# Altium footprint library microbuilder.PCBLIB: 422 footprints (part 21 of 27)
Each footprint in its own frame and in the unit in brackets; x right, y up, seen from the top. Pads: shape width x height; smd on the part's side, far side on the other; paste and mask are expansions set on the pad; w line width, h text height; cw(c..) or ccw(c..) is an arc to the next point about the centre after c.
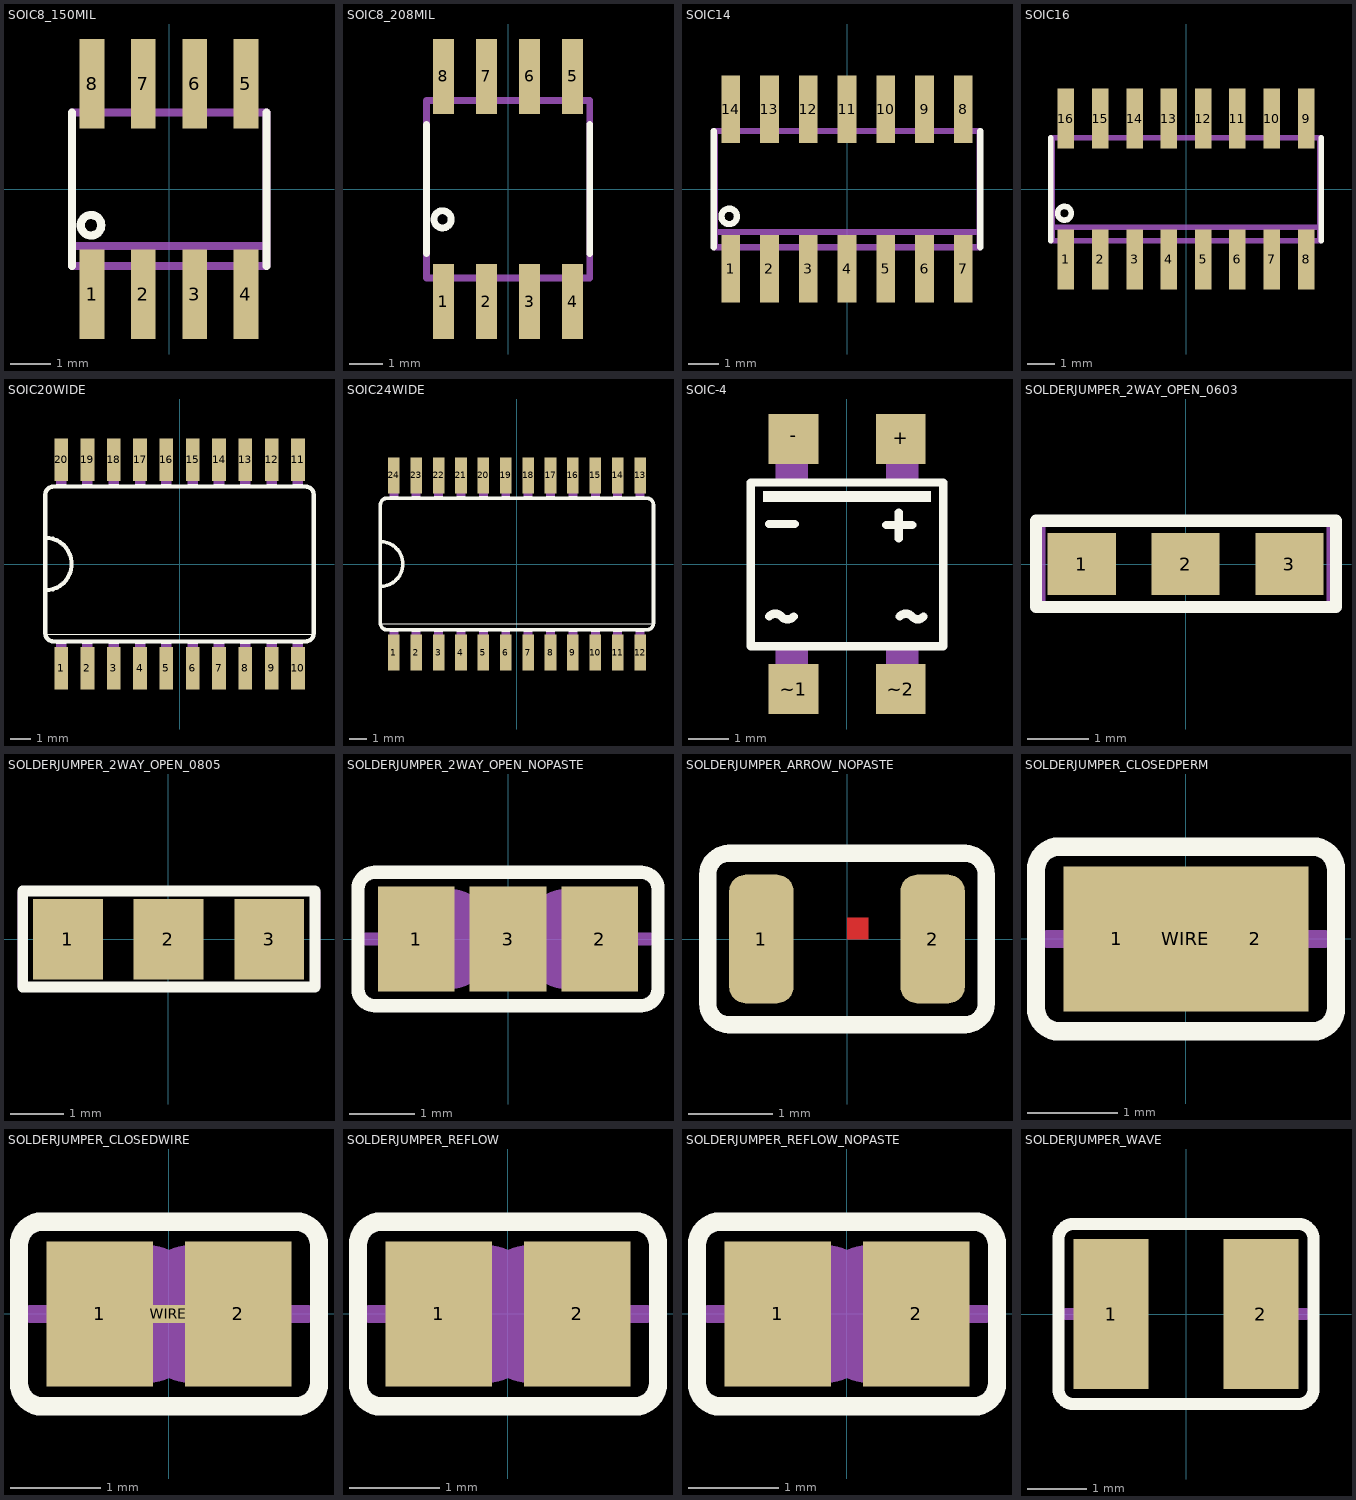
[diagram p20: the footprints below, top view; thin cyan lines are the x and y axes]

## SOIC8_150MIL [mil]
pads (8):
  rect 24x87 smd: 1(-75,-102.36) 2(-25,-102.36) 3(25,-102.36) 4(75,-102.36) 5(75,103) 6(25,103) 7(-25,103) 8(-75,103)
Top Overlay:
  circle w8: c-76,-35 r10
  lines w8: -94.49,-74.8 -94.49,75 ; 95,-74.8 95,75
Mechanical 16:
  rectangle: -84.65,-122.05 -65.35,-78.74
  rectangle: -34.65,-122.05 -15.35,-78.74
  rectangle: 16,-122.05 35,-78.74
  rectangle: 66,-122.05 85,-78.74
  rectangle: 66,79 85,123
  rectangle: 16,79 35,123
  rectangle: -34.65,79 -15.35,123
  rectangle: -84.65,79 -65.35,123
  lines w8: -94.49,-55.12 -94.49,-74.8 95,-74.8 95,-55.12 ; -94.49,-55.12 -94.49,75 95,75 95,-55.12 ; -94.49,-55.12 95,-55.12

## SOIC8_208MIL [mil]
pads (8):
  rect 24x87 smd: 1(-75,-130.51) 2(-25,-130.51) 3(25,-130.51) 4(75,-130.51) 5(75,131) 6(25,131) 7(-25,131) 8(-75,131)
Top Overlay:
  circle w8: c-76,-35 r10
  lines w8: -94.49,-74.8 -94.49,75 ; 95,-74.8 95,75
Mechanical 16:
  rectangle: -84.65,-150.2 -65.35,-106.89
  rectangle: -34.65,-150.2 -15.35,-106.89
  rectangle: 16,-150.2 35,-106.89
  rectangle: 66,-150.2 85,-106.89
  rectangle: 66,107 85,151
  rectangle: 16,107 35,151
  rectangle: -34.65,107 -15.35,151
  rectangle: -84.65,107 -65.35,151
  lines w8: -94.49,-102.95 95,-102.95 95,103 -94.49,103 -94.49,-102.95

## SOIC14 [mil]
pads (14):
  rect 24x87 smd: 1(-150,-102.36) 2(-100,-102.36) 3(-50,-102.36) 4(0,-102.36) 5(50,-102.36) 6(100,-102.36) 7(150,-102.36) 8(150,103) 9(100,103) 10(50,103) 11(0,103) 12(-50,103) 13(-100,103) 14(-150,103)
Top Overlay:
  circle w8: c-152,-35 r10
  lines w8: -171.85,-74.8 -171.85,75 ; 172,-74.8 172,75
Mechanical 16:
  rectangle: -159.65,-122.05 -140.35,-78.74
  rectangle: -109.65,-122.05 -90.35,-78.74
  rectangle: -59.65,-122.05 -40.35,-78.74
  rectangle: -9.65,-122.05 10,-78.74
  rectangle: 91,79 110,123
  rectangle: 41,79 60,123
  rectangle: -9.65,79 10,123
  rectangle: -59.65,79 -40.35,123
  rectangle: 41,-122.05 60,-78.74
  rectangle: 91,-122.05 110,-78.74
  rectangle: 141,-122.05 160,-78.74
  rectangle: 141,79 160,123
  rectangle: -109.65,79 -90.35,123
  rectangle: -159.65,79 -140.35,123
  lines w8: -170.28,-55.12 -170.28,-74.8 171,-74.8 171,-55.12 ; -170.28,-55.12 -170.28,75 171,75 171,-55.12 ; -170.28,-55.12 171,-55.12

## SOIC16 [mil]
pads (16):
  rect 24x87 smd: 1(-175,-102.36) 2(-125,-102.36) 3(-75,-102.36) 4(-25,-102.36) 5(25,-102.36) 6(75,-102.36) 7(125,-102.36) 8(175,-102.36) 9(175,103) 10(125,103) 11(75,103) 12(25,103) 13(-25,103) 14(-75,103) 15(-125,103) 16(-175,103)
Top Overlay:
  circle w8: c-177,-35 r10
  lines w8: -196.85,-74.8 -196.85,75 ; 197,-74.8 197,75
Mechanical 16:
  rectangle: -184.65,-122.05 -165.35,-78.74
  rectangle: -134.65,-122.05 -115.35,-78.74
  rectangle: -84.65,-122.05 -65.35,-78.74
  rectangle: -34.65,-122.05 -15.35,-78.74
  rectangle: 66,79 85,123
  rectangle: 16,79 35,123
  rectangle: -34.65,79 -15.35,123
  rectangle: -84.65,79 -65.35,123
  rectangle: 16,-122.05 35,-78.74
  rectangle: 66,-122.05 85,-78.74
  rectangle: 116,-122.05 135,-78.74
  rectangle: 166,-122.05 185,-78.74
  rectangle: 166,79 185,123
  rectangle: 116,79 135,123
  rectangle: -134.65,79 -115.35,123
  rectangle: -184.65,79 -165.35,123
  lines w8: -194.49,-55.12 -194.49,-74.8 195,-74.8 195,-55.12 ; -194.49,-55.12 -194.49,75 195,75 195,-55.12 ; -194.49,-55.12 195,-55.12

## SOIC20WIDE [mil]
pads (20):
  rect 26x80 smd: 1(-225,-198) 2(-175,-198) 3(-125,-198) 4(-75,-198) 5(-25,-198) 6(25,-198) 7(75,-198) 8(125,-198) 9(175,-198) 10(225,-198) 11(225,198) 12(175,198) 13(125,198) 14(75,198) 15(25,198) 16(-25,198) 17(-75,198) 18(-125,198) 19(-175,198) 20(-225,198)
Top Overlay:
  rectangle: -235,-152 -215,-147
  rectangle: -185,-152 -165,-147
  rectangle: -135,-152 -115,-147
  rectangle: -85,-152 -65,-147
  rectangle: -35,-152 -15,-147
  rectangle: 15,-152 35,-147
  rectangle: 65,-152 85,-147
  rectangle: 115,-152 135,-147
  rectangle: -235,147 -215,152
  rectangle: -185,147 -165,152
  rectangle: -135,147 -115,152
  rectangle: -85,147 -65,152
  rectangle: -35,147 -15,152
  rectangle: 15,147 35,152
  rectangle: 65,147 85,152
  rectangle: 115,147 135,152
  rectangle: 165,147 185,152
  rectangle: 215,147 235,152
  rectangle: 165,-152 185,-147
  rectangle: 215,-152 235,-147
  lines w2: -255,-133 255,-133
  lines w8: -255,-50 -255,50 ; -255,-50 -255,-132 ccw(c-240,-132) -240,-147 240,-147 ccw(c240,-132) 255,-132 255,132 ccw(c240,132) 240,147 -240,147 ccw(c-240,132) -255,132 -255,50 ; -255,-50 ccw(c-255,0) -255,50
Mechanical 16:
  rectangle: -235,-210 -215,-152
  rectangle: -185,-210 -165,-152
  rectangle: -135,-210 -115,-152
  rectangle: -85,-210 -65,-152
  rectangle: -35,-210 -15,-152
  rectangle: 15,-210 35,-152
  rectangle: 65,-210 85,-152
  rectangle: 115,-210 135,-152
  rectangle: -235,152 -215,210
  rectangle: -185,152 -165,210
  rectangle: -135,152 -115,210
  rectangle: -85,152 -65,210
  rectangle: -35,152 -15,210
  rectangle: 15,152 35,210
  rectangle: 65,152 85,210
  rectangle: 115,152 135,210
  rectangle: 165,152 185,210
  rectangle: 215,152 235,210
  rectangle: 165,-210 185,-152
  rectangle: 215,-210 235,-152

## SOIC24WIDE [mil]
pads (24):
  rect 26x80 smd: 1(-275,-198) 2(-225,-198) 3(-175,-198) 4(-125,-198) 5(-75,-198) 6(-25,-198) 7(25,-198) 8(75,-198) 9(125,-198) 10(175,-198) 11(225,-198) 12(275,-198) 13(275,198) 14(225,198) 15(175,198) 16(125,198) 17(75,198) 18(25,198) 19(-25,198) 20(-75,198) 21(-125,198) 22(-175,198) 23(-225,198) 24(-275,198)
Top Overlay:
  rectangle: -285,-152 -265,-147
  rectangle: -235,-152 -215,-147
  rectangle: -185,-152 -165,-147
  rectangle: -135,-152 -115,-147
  rectangle: -85,-152 -65,-147
  rectangle: -35,-152 -15,-147
  rectangle: 15,-152 35,-147
  rectangle: 65,-152 85,-147
  rectangle: -285,147 -265,152
  rectangle: -235,147 -215,152
  rectangle: -185,147 -165,152
  rectangle: -135,147 -115,152
  rectangle: -85,147 -65,152
  rectangle: -35,147 -15,152
  rectangle: 15,147 35,152
  rectangle: 65,147 85,152
  rectangle: 115,147 135,152
  rectangle: 165,147 185,152
  rectangle: 215,147 235,152
  rectangle: 265,147 285,152
  rectangle: 115,-152 135,-147
  rectangle: 165,-152 185,-147
  rectangle: 215,-152 235,-147
  rectangle: 265,-152 285,-147
  lines w2: -305,-133 305,-133
  lines w8: -305,-50 -305,50 ; -305,-50 -305,-132 ccw(c-290,-132) -290,-147 290,-147 ccw(c290,-132) 305,-132 305,132 ccw(c290,132) 290,147 -290,147 ccw(c-290,132) -305,132 -305,50 ; -305,-50 ccw(c-305,0) -305,50
Mechanical 16:
  rectangle: -285,-210 -265,-152
  rectangle: -235,-210 -215,-152
  rectangle: -185,-210 -165,-152
  rectangle: -135,-210 -115,-152
  rectangle: -85,-210 -65,-152
  rectangle: -35,-210 -15,-152
  rectangle: 15,-210 35,-152
  rectangle: 65,-210 85,-152
  rectangle: -285,152 -265,210
  rectangle: -235,152 -215,210
  rectangle: -185,152 -165,210
  rectangle: -135,152 -115,210
  rectangle: -85,152 -65,210
  rectangle: -35,152 -15,210
  rectangle: 15,152 35,210
  rectangle: 65,152 85,210
  rectangle: 115,152 135,210
  rectangle: 165,152 185,210
  rectangle: 215,152 235,210
  rectangle: 265,152 285,210
  rectangle: 115,-210 135,-152
  rectangle: 165,-210 185,-152
  rectangle: 215,-210 235,-152
  rectangle: 265,-210 285,-152

## SOIC-4 [mil]
pads (4):
  rect 48x48 smd: +(52,121) -(-51.18,121) ~1(-51.18,-120.08) ~2(52,-120.08)
Top Overlay:
  rectangle: -80.71,60 81,71
  lines w8: -75,39 -50,39 ; -74.8,-50.2 cw(c-68.9,-55.16) -62.99,-50.2 ccw(c-57.09,-45.24) -51.18,-50.2 ; 38,38 63,38 ; 50,25 50,50 ; 51,-50.2 cw(c57,-55.24) 63,-50.2 ccw(c68.5,-45.58) 74,-50.2 ; -92.52,-78.74 93,-78.74 93,79 -92.52,79 -92.52,-78.74
Mechanical 16:
  rectangle: -68.9,81 -37.4,136
  rectangle: 38,81 69,136
  region: 69,-80.71 38,-80.71 38,-135.83 69,-135.83
  region: -37.4,-80.71 -68.9,-80.71 -68.9,-135.83 -37.4,-135.83

## SOLDERJUMPER_2WAY_OPEN_0603 [mil]
pads (3):
  rect 44x40 smd: 1(-66.93,0) 2(0,0) 3(67,0)
Top Overlay:
  lines w8: -96.46,-27.56 97,-27.56 97,28 -96.46,28 -96.46,-27.56
Mechanical 16:
  text "1" at -73.58,-11.54 h37.2
  text "2" at -8.94,-11.54 h37.2
  text "3" at 61,-11.54 h37.2
Mechanical 27:
  lines w2: -91.46,-28.7 92,-28.7 92,29 -91.46,29 -91.46,-28.7

## SOLDERJUMPER_2WAY_OPEN_0805 [mil]
pads (3):
  rect 52x60 smd: 1(-74.8,0) 2(0,0) 3(75,0)
Top Overlay:
  lines w8: -108.27,-35.43 109,-35.43 109,36 -108.27,36 -108.27,-35.43
Mechanical 16:
  text "1" at -80.71,-7.87 h37.2
  text "2" at -5.91,-7.87 h37.2
  text "3" at 69,-7.87 h37.2
Mechanical 27:
  lines w2: -111.14,-34.76 112,-34.76 112,35 -111.14,35 -111.14,-34.76

## SOLDERJUMPER_2WAY_OPEN_NOPASTE [mil]
pads (3):
  rect 46x63 smd: 1(-55,0) 2(55,0) 3(0,0)
Top Overlay:
  lines w8: -90,-30 ccw(c-80,-30) -80,-40 80,-40 ccw(c80,-30) 90,-30 90,30 ccw(c80,30) 80,40 -80,40 ccw(c-80,30) -90,30 -90,-30
Mechanical 16:
  rectangle: -20,-30 20,30
  lines w8: -85,0 -65,0 ; 65,0 85,0
  lines w50: -35,-5 cw(c-35,0) -35,5 ; 35,-5 ccw(c35,0) 35,5
  text "1" at -130,-25 h77.5
  text "3" at 100,-25 h77.5

## SOLDERJUMPER_ARROW_NOPASTE [mil]
pads (2):
  rrect50% 30x60 smd: 1(-40,0) 2(40,0)
Top Layer:
  region: 0,0 10,0 10,10 0,10
  region: 0,0 10,0 10,10 0,10
Top Overlay:
  lines w8: -65,-30 ccw(c-55,-30) -55,-40 55,-40 ccw(c55,-30) 65,-30 65,30 ccw(c55,30) 55,40 -55,40 ccw(c-55,30) -65,30 -65,-30
Top Solder:
  rectangle: -57.5,-32.5 58,33

## SOLDERJUMPER_CLOSEDPERM [mil]
pads (3):
  rect 46x63 smd: 1(-30,0) 2(30,0)
  rect 25x63 smd: WIRE(0,0)
Top Overlay:
  lines w8: -65,-30 ccw(c-55,-30) -55,-40 55,-40 ccw(c55,-30) 65,-30 65,30 ccw(c55,30) 55,40 -55,40 ccw(c-55,30) -65,30 -65,-30
Top Solder:
  rectangle: -3,-36 3,36
Mechanical 16:
  lines w8: -60,0 -40,0 ; 40,0 60,0
  lines w50: -10,-5 cw(c-10,0) -10,5 ; 10,-5 ccw(c10,0) 10,5

## SOLDERJUMPER_CLOSEDWIRE [mil]
pads (3):
  rect 46x63 smd: 1(-30,0) 2(30,0)
  rect 25x8 smd: WIRE(0,0)
Top Overlay:
  lines w8: -65,-30 ccw(c-55,-30) -55,-40 55,-40 ccw(c55,-30) 65,-30 65,30 ccw(c55,30) 55,40 -55,40 ccw(c-55,30) -65,30 -65,-30
Top Solder:
  rectangle: -3,-36 3,36
Mechanical 16:
  lines w8: -60,0 -40,0 ; 40,0 60,0
  lines w50: -10,-5 cw(c-10,0) -10,5 ; 10,-5 ccw(c10,0) 10,5

## SOLDERJUMPER_REFLOW [mil]
pads (2):
  rect 46x63 smd: 1(-30,0) 2(30,0)
Top Overlay:
  lines w8: -65,-30 ccw(c-55,-30) -55,-40 55,-40 ccw(c55,-30) 65,-30 65,30 ccw(c55,30) 55,40 -55,40 ccw(c-55,30) -65,30 -65,-30
Top Solder:
  rectangle: -3,-36 3,36
Mechanical 16:
  lines w8: -60,0 -40,0 ; 40,0 60,0
  lines w50: -10,-5 cw(c-10,0) -10,5 ; 10,-5 ccw(c10,0) 10,5

## SOLDERJUMPER_REFLOW_NOPASTE [mil]
pads (2):
  rect 46x63 smd: 1(-30,0) 2(30,0)
Top Overlay:
  lines w8: -65,-30 ccw(c-55,-30) -55,-40 55,-40 ccw(c55,-30) 65,-30 65,30 ccw(c55,30) 55,40 -55,40 ccw(c-55,30) -65,30 -65,-30
Top Solder:
  rectangle: -3,-36 3,36
Mechanical 16:
  lines w8: -60,0 -40,0 ; 40,0 60,0
  lines w50: -10,-5 cw(c-10,0) -10,5 ; 10,-5 ccw(c10,0) 10,5

## SOLDERJUMPER_WAVE [mil]
pads (2):
  rect 50x100 smd: 1(-50,0) 2(50,0)
Top Overlay:
  lines w8: -85,-50 ccw(c-75,-50) -75,-60 75,-60 ccw(c75,-50) 85,-50 85,50 ccw(c75,50) 75,60 -75,60 ccw(c-75,50) -85,50 -85,-50
Mechanical 16:
  rectangle: 30,-30 40,30
  rectangle: 40,-25 50,25
  rectangle: 50,-20 55,20
  rectangle: 55,-10 60,10
  rectangle: -40,-30 -30,30
  rectangle: -50,-25 -40,25
  rectangle: -55,-20 -50,20
  rectangle: -60,-10 -55,10
  rectangle: 38,-28 43,-23
  rectangle: 53,-14 58,-9
  rectangle: 53,8 58,13
  rectangle: 38,23 43,28
  rectangle: -43,-28 -38,-23
  rectangle: -57,-13 -52,-8
  rectangle: -58,8 -53,13
  rectangle: -44,23 -39,28
  lines w8: -80,0 -60,0 ; 60,0 80,0 ; -30,-30 -30,30 ccw(c-30,0) -30,-30 ; 30,-30 30,30 cw(c30,0) 30,-30